# Altium footprint library Transistor.PcbLib: 86 footprints (part 3 of 6)
Each footprint in its own frame and in the unit in brackets; x right, y up, seen from the top. Pads: shape width x height; smd on the part's side, far side on the other; paste and mask are expansions set on the pad; w line width, h text height; cw(c..) or ccw(c..) is an arc to the next point about the centre after c.
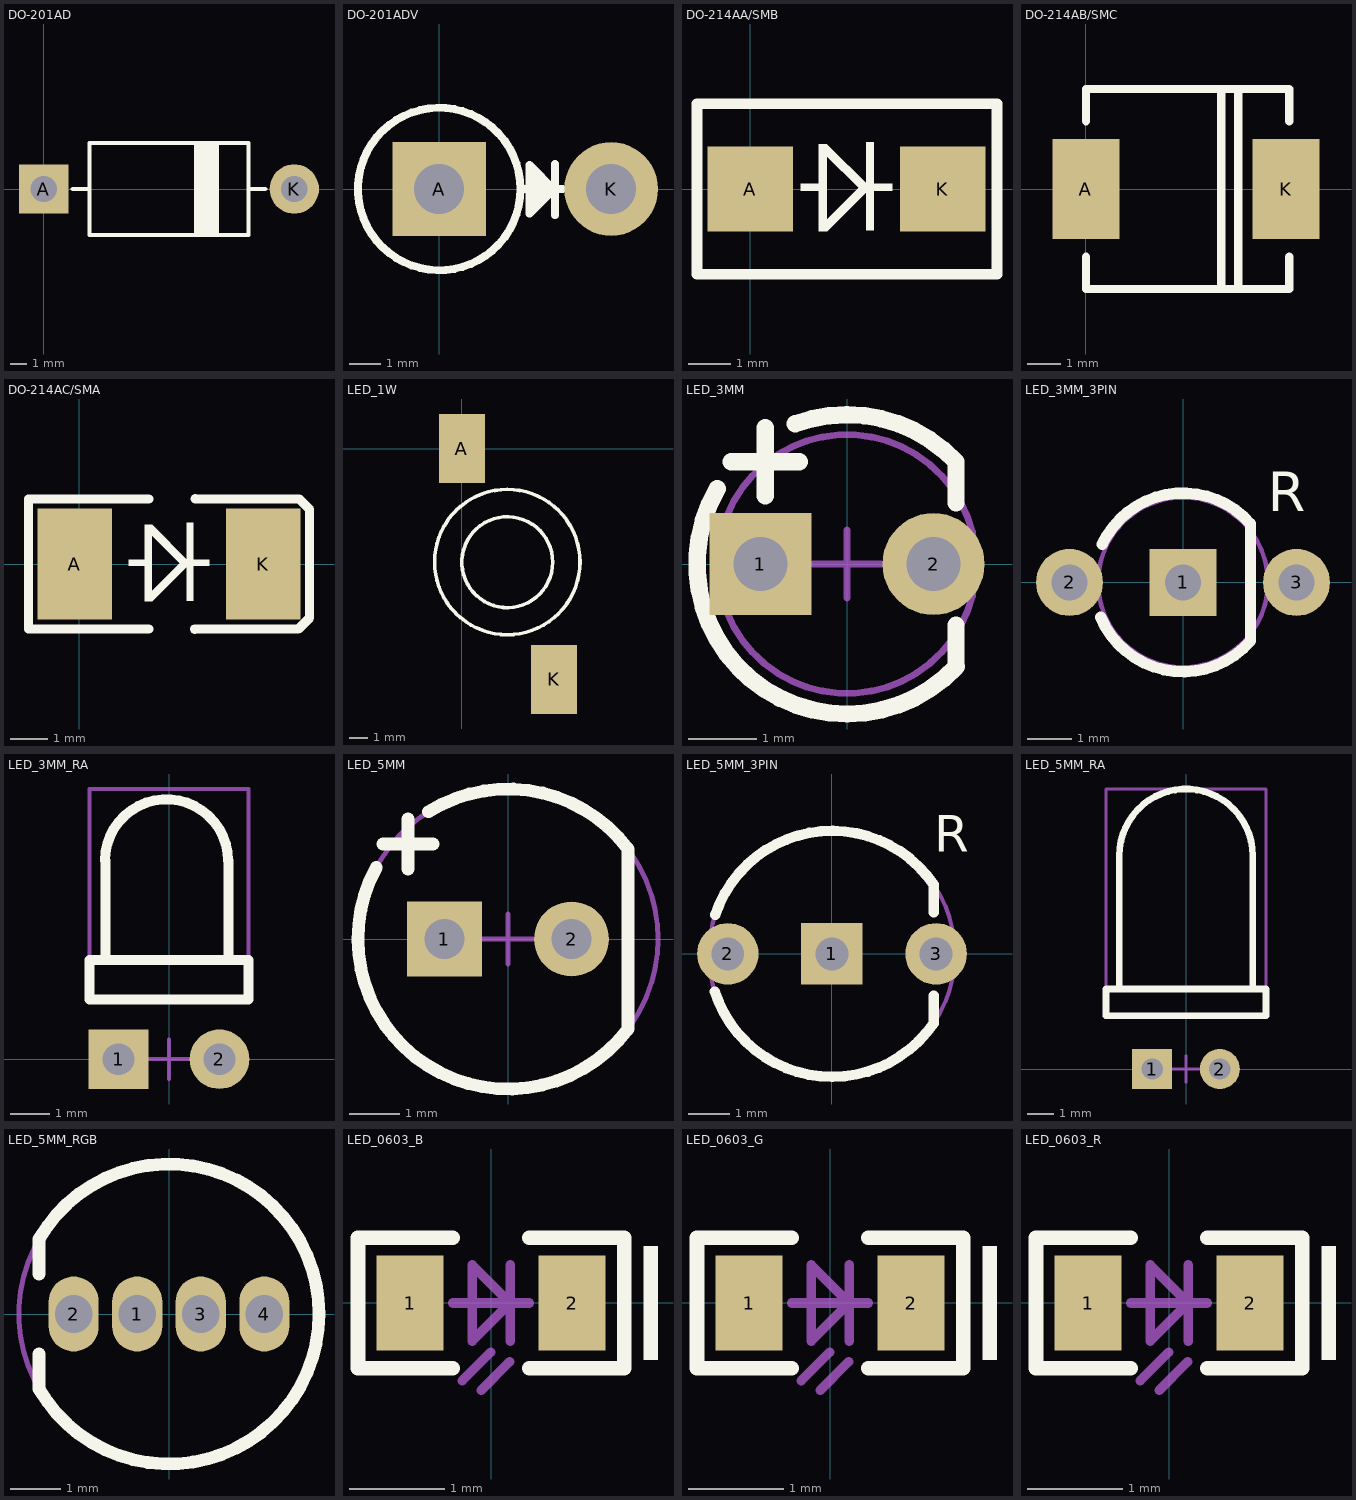
[diagram p2: the footprints below, top view; thin cyan lines are the x and y axes]

## DO-201AD [mm]
pads (2):
  rect 3x3 hole 1.6: A(0,0)
  round 3 hole 1.6: K(15.2,0)
Top Overlay:
  rectangle: 9.124,-2.794 10.648,2.794
  lines w0.254: 1.758,0 2.774,0 ; 12.426,0 13.442,0 ; 2.774,-2.794 12.426,-2.794 12.426,2.794 2.774,2.794 2.774,-2.794
3D body "DO-201AD.STEP": height 5.25, standoff -3.45, extent -0.63,-2.54 15.87,2.661

## DO-201ADV [mm]
pads (2):
  rect 3x3 hole 1.6: A(0,0)
  round 3 hole 1.6: K(5.5,0)
Top Overlay:
  circle w0.254: c0,0 r2.6
  lines w0.254: 2.616,0 3.698,0 ; 3.048,0.559 3.073,-0.432 3.556,0 ; 3.302,-0.254 3.302,0 3.302,0.254 3.556,0 ; 3.658,-0.02 2.885,-0.792 2.885,0.775 3.698,-0.038 ; 3.698,-0.841 3.698,0.805 ; 3.937,0 3.556,0
3D body "DO-201ADV.STEP": height 12, standoff -3.45, extent -2.598,-2.667 6.154,2.534

## DO-214AA/SMB [mil] "塑封二极管"
pads (2):
  rect 80x80 smd: A(0,0) K(180,0)
Top Overlay:
  region: 133,-2 133,5 114,5 114,-2
  region: 105.57,-3.58 111.58,2.42 72,42 65.99,35.99
  region: 65,-2 65,5 47,5 47,-2
  rectangle: 108.5,-39 116,44
  rectangle: 64,-40 72,42
  region: 111.61,-0.46 105.61,5.55 66.03,-34.03 72.04,-40.04
  lines w10: -50,-80 -50,80 231,80 231,-80 -50,-80
3D body "DO-214AA.STEP": height 98.43, standoff 0, extent -20.24,-78.54 200.24,75

## DO-214AB/SMC [mm] "塑封二极管"
pads (2):
  rect 2x3 smd: A(0,0) K(6,0)
Top Overlay:
  lines w0.254: 0,-2.032 0,-3 6.096,-3 6.096,-2.032 ; 0,2.032 0,3 6.096,3 6.096,2.032 ; 4.064,-3 4.064,3 ; 4.572,-3 4.572,3
3D body "DO-214AB.STEP": height 2.7, standoff 0, extent -1.012,-3.1 7.108,3.1

## DO-214AC/SMA [mm] "塑封二极管"
pads (2):
  rect 2x3 smd: A(-0.127,0) K(4.953,0)
Top Overlay:
  region: 2.962,-0.012 2.809,0.141 1.804,-0.864 1.957,-1.017
  rectangle: 1.753,-1.016 1.956,1.067
  rectangle: 2.883,-0.991 3.073,1.118
  region: 1.778,-0.051 1.778,0.127 1.321,0.127 1.321,-0.051
  region: 2.808,-0.091 2.961,0.062 1.956,1.067 1.803,0.914
  region: 3.505,-0.051 3.505,0.127 3.023,0.127 3.023,-0.051
  lines w0.254: 1.873,-1.75 -1.372,-1.75 -1.372,1.75 1.873,1.75 ; 3.103,-1.753 3.105,-1.75 5.668,-1.75 5.899,-1.75 6.198,-1.452 6.198,1.473 5.921,1.75 5.69,1.75 3.127,1.75 3.124,1.753
3D body "DO-214AC.STEP": height 2.4, standoff 0, extent 0.113,-1.35 4.713,1.35

## LED_1W [mm]
pads (2):
  rect 2.54x3.81 smd: A(0,0) K(5.08,-12.7)
Top Overlay:
  circle w0.2: c2.5,-6.25 r2.5
  circle w0.2: c2.5,-6.242 r4
3D body: height 0.89, standoff 0.25, extent -1,-5.25 1,-1.5
3D body: height 0.89, standoff 0.25, extent 4,-11 6,-8
3D body: height 3.25, standoff 0.25, extent -1.468,-10.234 6.5,-2.25
3D body: height 5.55, standoff 0.55, extent 0.026,-8.729 5,-3.75
3D body: height 0.5, standoff 0.25, extent 4,-14.25 6,-11
3D body: height 0.5, standoff 0.25, extent -1,-1.5 1,1.5

## LED_3MM [mm]
pads (2):
  rect 1.5x1.5 hole 0.8: 1(-1.27,0)
  round 1.5 hole 0.8: 2(1.27,0)
Top Overlay:
  lines w0.254: -1.906,1.103 ccw(c0,0) 1.607,-1.506 ; -1.7,1.5 -0.7,1.5 ; -1.2,1 -1.2,2 ; -0.758,2.058 cw(c0,0) 1.6,1.5 1.6,0.9 ; 1.6,-1.5 1.6,-0.9
Mechanical 15:
  circle w0.1: c0,0 r1.9
  lines w0.1: -0.5,0 0.5,0 ; 0,-0.5 0,0.5
3D body "LED Red 3mm.STEP": height 5.2, standoff -3, extent -1.942,-1.986 1.542,2

## LED_3MM_3PIN [mm]
pads (3):
  rect 1.5x1.5 hole 0.8: 1(0,0)
  round 1.5 hole 0.8: 2(-2.54,0) 3(2.54,0)
Top Overlay:
  lines w0.254: -1.843,-0.776 ccw(c0,0) 1.511,-1.31 1.511,1.31 ccw(c0,0) -1.81,0.852
  text "R" at 1.9,1.3 h1.52
Mechanical 15:
  circle w0.1: c0,0 r1.9
3D body "LED 3mm 3pin.step": height 7.71, standoff -2.33, extent -2.794,-2.048 2.794,2

## LED_3MM_RA [mm]
pads (2):
  rect 1.5x1.5 hole 0.8: 1(-1.27,0)
  round 1.5 hole 0.8: 2(1.27,0)
Top Overlay:
  lines w0.254: -1.612,5 cw(c-0.062,4.992) 1.488,5 ; -1.6,2.5 -1.6,5 ; 1.5,2.5 1.5,5 ; -2,1.5 2,1.5 2,2.5 -2,2.5 -2,1.5
Mechanical 15:
  lines w0.1: -0.5,0 0.5,0 ; 0,-0.5 0,0.5 ; -2,1.5 -2,6.8 2,6.8 2,1.5 -2,1.5
3D body "LED Red 3mm V.STEP": height 3.99, standoff -2, extent -1.567,-0.2 1.967,6.552

## LED_5MM [mm]
pads (2):
  rect 1.5x1.5 hole 0.8: 1(-1.27,0)
  round 1.5 hole 0.8: 2(1.27,0)
Top Overlay:
  lines w0.254: -2.638,1.429 ccw(c0,0) 2.4,-1.8 2.4,1.8 ccw(c0,0) -1.59,2.544 ; -2.5,1.9 -1.5,1.9 ; -2,1.4 -2,2.4
Mechanical 15:
  circle w0.1: c0,0 r3
  lines w0.1: -0.5,0 0.5,0 ; 0,-0.5 0,0.5
3D body "User Library-LED5ON-Red.step": height 8.5, standoff -5, extent -3,-3 2.5,3

## LED_5MM_3PIN [mm]
pads (3):
  rect 1.5x1.5 hole 0.8: 1(0,0)
  round 1.5 hole 0.8: 2(-2.54,0) 3(2.54,0)
Top Overlay:
  lines w0.254: -2.856,-0.918 ccw(c0,0) 2.481,-1.687 2.481,-1.019 ; -2.846,0.949 cw(c0,0) 2.481,1.687 2.481,1.019
  text "R" at 2.5,2.2 h1.52
Mechanical 15:
  circle w0.1: c0,0 r3
3D body "LED 5mm 3 pin.step": height 12.5, standoff -3.5, extent -3.012,-2.9 2.932,2.9

## LED_5MM_RA [mm]
pads (2):
  rect 1.5x1.5 hole 0.8: 1(-1.27,0)
  round 1.5 hole 0.8: 2(1.27,0)
Top Overlay:
  lines w0.254: -2.5,3 -2.5,8 cw(c0,8) 2.5,8 2.5,3 ; -3,2 -3,3 3,3 3,2 -3,2
Mechanical 15:
  lines w0.1: -0.5,0 0.5,0 ; 0,-0.5 0,0.5 ; -3,2 3,2 3,10.5 -3,10.5 -3,2
3D body "LED Red 5mm V.STEP": height 5.99, standoff -3, extent -2.626,-0.261 3,10.461

## LED_5MM_RGB [mm]
pads (4):
  oval 1x1.5 hole 0.75: 1(-0.635,0) 2(-1.905,0) 3(0.635,0) 4(1.905,0)
Top Overlay:
  lines w0.254: -2.599,-0.8 -2.599,-1.499 ccw(c0,0) -2.598,1.5 -2.598,0.802
Mechanical 15:
  circle w0.1: c0,0 r3
3D body "LED-RGB 5mm.STEP": height 9.7, standoff -3, extent -2.505,-2.9 2.895,2.9

## LED_0603_B [mm]
pads (2):
  rect 0.7x1 smd: 1(-0.85,0) 2(0.85,0)
Top Overlay:
  region: 1.753,0.6 1.599,0.6 1.599,-0.6 1.753,-0.6
  lines w0.152: -0.4,-0.686 -1.397,-0.686 -1.397,0.686 -0.4,0.686 ; 0.4,-0.686 1.397,-0.686 1.397,0.686 0.4,0.686
Mechanical 13:
  lines w0.1: -0.4,0 0.4,0 ; -0.305,-0.817 -0.005,-0.517 ; -0.105,-0.917 0.195,-0.617 ; 0.2,-0.4 0.2,0.4 ; -0.2,-0.4 -0.2,0.4 0.2,0 -0.2,-0.4
3D body "18.STEP": height 0.61, standoff 0, extent -0.8,-0.381 0.8,0.421

## LED_0603_G [mm]
pads (2):
  rect 0.7x1 smd: 1(-0.85,0) 2(0.85,0)
Top Overlay:
  region: 1.753,0.6 1.599,0.6 1.599,-0.6 1.753,-0.6
  lines w0.152: -0.4,-0.686 -1.397,-0.686 -1.397,0.686 -0.4,0.686 ; 0.4,-0.686 1.397,-0.686 1.397,0.686 0.4,0.686
Mechanical 13:
  lines w0.1: -0.4,0 0.4,0 ; -0.305,-0.817 -0.005,-0.517 ; -0.105,-0.917 0.195,-0.617 ; 0.2,-0.4 0.2,0.4 ; -0.2,-0.4 -0.2,0.4 0.2,0 -0.2,-0.4
3D body "17.STEP": height 0.61, standoff 0, extent -0.8,-0.381 0.8,0.421

## LED_0603_R [mm]
pads (2):
  rect 0.7x1 smd: 1(-0.85,0) 2(0.85,0)
Top Overlay:
  region: 1.753,0.6 1.599,0.6 1.599,-0.6 1.753,-0.6
  lines w0.152: -0.4,-0.686 -1.397,-0.686 -1.397,0.686 -0.4,0.686 ; 0.4,-0.686 1.397,-0.686 1.397,0.686 0.4,0.686
Mechanical 13:
  lines w0.1: -0.4,0 0.4,0 ; -0.305,-0.817 -0.005,-0.517 ; -0.105,-0.917 0.195,-0.617 ; 0.2,-0.4 0.2,0.4 ; -0.2,-0.4 0.2,0 -0.2,0.4 -0.2,-0.4
3D body "16.STEP": height 0.61, standoff 0, extent -0.8,-0.396 0.8,0.406